# Altium footprint library Connector_Samtec_HLE_SMD.PcbLib: 290 footprints (part 13 of 24) (continued)
## Samtec_HLE-134-02-xxx-DV-A_2x34_P2.54mm_Horizontal [mm] (continued)
F.CrtYd:
  lines w0.05: -43.68,-4.17 -43.68,4.17 43.68,4.17 43.68,-4.17 -43.68,-4.17
F.Fab:
  lines w0.1: -42.41,2.54 -41.91,1.833 -41.41,2.54 ; -43.18,-2.54 -43.18,2.54 43.18,2.54 43.18,-2.54 -43.18,-2.54
  text "'.Designator'" at -4.047,-2.68 h1

## Samtec_HLE-134-02-xxx-DV-BE-A_2x34_P2.54mm_Horizontal [mm]
pads (138):
  rect 1.27x1.68 smd: 1(-41.91,2.72) 2(-41.91,-2.72) 3(-39.37,2.72) 4(-39.37,-2.72) 5(-36.83,2.72) 6(-36.83,-2.72) 7(-34.29,2.72) 8(-34.29,-2.72) 9(-31.75,2.72) 10(-31.75,-2.72) 11(-29.21,2.72) 12(-29.21,-2.72) 13(-26.67,2.72) 14(-26.67,-2.72) 15(-24.13,2.72) 16(-24.13,-2.72) 17(-21.59,2.72) 18(-21.59,-2.72) 19(-19.05,2.72) 20(-19.05,-2.72) 21(-16.51,2.72) 22(-16.51,-2.72) 23(-13.97,2.72) 24(-13.97,-2.72) 25(-11.43,2.72) 26(-11.43,-2.72) 27(-8.89,2.72) 28(-8.89,-2.72) 29(-6.35,2.72) 30(-6.35,-2.72) 31(-3.81,2.72) 32(-3.81,-2.72) 33(-1.27,2.72) 34(-1.27,-2.72) 35(1.27,2.72) 36(1.27,-2.72) 37(3.81,2.72) 38(3.81,-2.72) 39(6.35,2.72) 40(6.35,-2.72) 41(8.89,2.72) 42(8.89,-2.72) 43(11.43,2.72) 44(11.43,-2.72) 45(13.97,2.72) 46(13.97,-2.72) 47(16.51,2.72) 48(16.51,-2.72) 49(19.05,2.72) 50(19.05,-2.72) 51(21.59,2.72) 52(21.59,-2.72) 53(24.13,2.72) 54(24.13,-2.72) 55(26.67,2.72) 56(26.67,-2.72) 57(29.21,2.72) 58(29.21,-2.72) 59(31.75,2.72) 60(31.75,-2.72) 61(34.29,2.72) 62(34.29,-2.72) 63(36.83,2.72) 64(36.83,-2.72) 65(39.37,2.72) 66(39.37,-2.72) 67(41.91,2.72) 68(41.91,-2.72)
  round 0.97 hole 0.97: Un1(-11.43,1.27) Un2(11.43,1.27) Un3(-26.67,-1.27) Un4(-13.97,1.27) Un5(-3.81,1.27) Un6(-31.75,-1.27) Un7(21.59,-1.27) Un8(29.21,1.27) Un9(19.05,1.27) Un10(-39.37,-1.27) Un11(-36.83,1.27) Un12(6.35,1.27) Un13(31.75,1.27) Un14(39.37,1.27) Un15(3.81,1.27) Un16(-34.29,-1.27) Un17(-19.05,-1.27) Un18(-11.43,-1.27) Un19(-6.35,1.27) Un20(36.83,-1.27) Un21(24.13,1.27) Un22(36.83,1.27) Un23(-3.81,-1.27) Un24(39.37,-1.27) Un26(41.91,1.27) Un27(-6.35,-1.27) Un28(-16.51,1.27) Un29(-8.89,-1.27) Un30(13.97,1.27) Un31(34.29,1.27) Un32(16.51,-1.27) Un33(26.67,1.27) Un34(1.27,1.27) Un35(34.29,-1.27) Un36(24.13,-1.27) Un37(-26.67,1.27) Un38(-41.91,1.27) Un39(-1.27,1.27) Un40(-39.37,1.27) Un41(11.43,-1.27) Un43(-29.21,1.27) Un44(-21.59,1.27) Un45(31.75,-1.27) Un46(-1.27,-1.27) Un47(-13.97,-1.27) Un48(21.59,1.27) Un49(8.89,1.27) Un50(-24.13,-1.27) Un51(6.35,-1.27) Un52(19.05,-1.27) Un53(29.21,-1.27) Un54(-29.21,-1.27) Un55(8.89,-1.27) Un56(-8.89,1.27) Un57(-34.29,1.27) Un58(-36.83,-1.27) Un59(-24.13,1.27) Un60(-21.59,-1.27) Un61(-31.75,1.27) Un62(41.91,-1.27) Un63(3.81,-1.27) Un64(-16.51,-1.27) Un65(13.97,-1.27) Un66(-41.91,-1.27) Un67(26.67,-1.27) Un68(-19.05,1.27) Un69(16.51,1.27) Un70(1.27,-1.27)
  round 1.78 hole 1.78: Un25(-40.64,0) Un42(40.64,0)
F.SilkS:
  lines w0.12: -42.805,-2.65 -43.29,-2.65 -43.29,2.65 -42.805,2.65 -42.805,3.56 ; -41.015,-2.65 -40.265,-2.65 ; -41.015,2.65 -40.265,2.65 ; -38.475,-2.65 -37.725,-2.65 ; -38.475,2.65 -37.725,2.65 ; -35.935,-2.65 -35.185,-2.65 ; -35.935,2.65 -35.185,2.65 ; -33.395,-2.65 -32.645,-2.65 ; -33.395,2.65 -32.645,2.65 ; -30.855,-2.65 -30.105,-2.65 ; -30.855,2.65 -30.105,2.65 ; -28.315,-2.65 -27.565,-2.65 ; -28.315,2.65 -27.565,2.65 ; -25.775,-2.65 -25.025,-2.65 ; -25.775,2.65 -25.025,2.65 ; -23.235,-2.65 -22.485,-2.65 ; -23.235,2.65 -22.485,2.65 ; -20.695,-2.65 -19.945,-2.65 ; -20.695,2.65 -19.945,2.65 ; -18.155,-2.65 -17.405,-2.65 ; -18.155,2.65 -17.405,2.65 ; -15.615,-2.65 -14.865,-2.65 ; -15.615,2.65 -14.865,2.65 ; -13.075,-2.65 -12.325,-2.65 ; -13.075,2.65 -12.325,2.65 ; -10.535,-2.65 -9.785,-2.65 ; -10.535,2.65 -9.785,2.65 ; -7.995,-2.65 -7.245,-2.65 ; -7.995,2.65 -7.245,2.65 ; -5.455,-2.65 -4.705,-2.65 ; -5.455,2.65 -4.705,2.65 ; -2.915,-2.65 -2.165,-2.65 ; -2.915,2.65 -2.165,2.65 ; -0.375,-2.65 0.375,-2.65 ; -0.375,2.65 0.375,2.65 ; 2.165,-2.65 2.915,-2.65 ; 2.165,2.65 2.915,2.65 ; 4.705,-2.65 5.455,-2.65 ; 4.705,2.65 5.455,2.65 ; 7.245,-2.65 7.995,-2.65 ; 7.245,2.65 7.995,2.65 ; 9.785,-2.65 10.535,-2.65 ; 9.785,2.65 10.535,2.65 ; 12.325,-2.65 13.075,-2.65 ; 12.325,2.65 13.075,2.65 ; 14.865,-2.65 15.615,-2.65 ; 14.865,2.65 15.615,2.65 ; 17.405,-2.65 18.155,-2.65 ; 17.405,2.65 18.155,2.65 ; 19.945,-2.65 20.695,-2.65 ; 19.945,2.65 20.695,2.65 ; 22.485,-2.65 23.235,-2.65 ; 22.485,2.65 23.235,2.65 ; 25.025,-2.65 25.775,-2.65 ; 25.025,2.65 25.775,2.65 ; 27.565,-2.65 28.315,-2.65 ; 27.565,2.65 28.315,2.65 ; 30.105,-2.65 30.855,-2.65 ; 30.105,2.65 30.855,2.65 ; 32.645,-2.65 33.395,-2.65 ; 32.645,2.65 33.395,2.65 ; 35.185,-2.65 35.935,-2.65 ; 35.185,2.65 35.935,2.65 ; 37.725,-2.65 38.475,-2.65 ; 37.725,2.65 38.475,2.65 ; 40.265,-2.65 41.015,-2.65 ; 40.265,2.65 41.015,2.65 ; 42.805,-2.65 43.29,-2.65 43.29,2.65 42.805,2.65
F.CrtYd:
  lines w0.05: -43.68,-4.06 43.68,-4.06 43.68,4.06 -43.68,4.06 -43.68,-4.06
F.Fab:
  lines w0.1: -42.41,2.54 -41.91,1.833 -41.41,2.54 ; -43.18,-2.54 43.18,-2.54 43.18,2.54 -43.18,2.54 -43.18,-2.54
  text "'.Designator'" at -4.047,-2.68 h1

## Samtec_HLE-134-02-xxx-DV-BE-LC_2x34_P2.54mm_Horizontal [mm]
pads (138):
  rect 1.27x1.68 smd: 1(-41.91,2.72) 2(-41.91,-2.72) 3(-39.37,2.72) 4(-39.37,-2.72) 5(-36.83,2.72) 6(-36.83,-2.72) 7(-34.29,2.72) 8(-34.29,-2.72) 9(-31.75,2.72) 10(-31.75,-2.72) 11(-29.21,2.72) 12(-29.21,-2.72) 13(-26.67,2.72) 14(-26.67,-2.72) 15(-24.13,2.72) 16(-24.13,-2.72) 17(-21.59,2.72) 18(-21.59,-2.72) 19(-19.05,2.72) 20(-19.05,-2.72) 21(-16.51,2.72) 22(-16.51,-2.72) 23(-13.97,2.72) 24(-13.97,-2.72) 25(-11.43,2.72) 26(-11.43,-2.72) 27(-8.89,2.72) 28(-8.89,-2.72) 29(-6.35,2.72) 30(-6.35,-2.72) 31(-3.81,2.72) 32(-3.81,-2.72) 33(-1.27,2.72) 34(-1.27,-2.72) 35(1.27,2.72) 36(1.27,-2.72) 37(3.81,2.72) 38(3.81,-2.72) 39(6.35,2.72) 40(6.35,-2.72) 41(8.89,2.72) 42(8.89,-2.72) 43(11.43,2.72) 44(11.43,-2.72) 45(13.97,2.72) 46(13.97,-2.72) 47(16.51,2.72) 48(16.51,-2.72) 49(19.05,2.72) 50(19.05,-2.72) 51(21.59,2.72) 52(21.59,-2.72) 53(24.13,2.72) 54(24.13,-2.72) 55(26.67,2.72) 56(26.67,-2.72) 57(29.21,2.72) 58(29.21,-2.72) 59(31.75,2.72) 60(31.75,-2.72) 61(34.29,2.72) 62(34.29,-2.72) 63(36.83,2.72) 64(36.83,-2.72) 65(39.37,2.72) 66(39.37,-2.72) 67(41.91,2.72) 68(41.91,-2.72)
  round 0.97 hole 0.97: Un1(3.81,1.27) Un2(-29.21,-1.27) Un3(-39.37,-1.27) Un4(11.43,1.27) Un5(41.91,-1.27) Un6(-21.59,-1.27) Un7(-31.75,1.27) Un8(26.67,1.27) Un9(-11.43,-1.27) Un10(31.75,-1.27) Un11(34.29,-1.27) Un12(-36.83,-1.27) Un13(-19.05,-1.27) Un14(36.83,1.27) Un15(-16.51,-1.27) Un16(-13.97,-1.27) Un17(21.59,1.27) Un18(41.91,1.27) Un19(-8.89,1.27) Un20(24.13,1.27) Un22(-6.35,-1.27) Un23(-16.51,1.27) Un24(1.27,1.27) Un25(1.27,-1.27) Un26(-29.21,1.27) Un27(26.67,-1.27) Un28(-3.81,1.27) Un29(6.35,-1.27) Un30(29.21,1.27) Un31(19.05,-1.27) Un32(24.13,-1.27) Un33(-8.89,-1.27) Un34(16.51,-1.27) Un35(13.97,-1.27) Un36(-24.13,-1.27) Un37(-41.91,1.27) Un38(-11.43,1.27) Un39(29.21,-1.27) Un40(-39.37,1.27) Un41(-41.91,-1.27) Un42(-21.59,1.27) Un43(-13.97,1.27) Un44(-3.81,-1.27) Un45(39.37,-1.27) Un46(39.37,1.27) Un47(11.43,-1.27) Un48(-34.29,1.27) Un49(34.29,1.27) Un50(-6.35,1.27) Un51(8.89,1.27) Un52(3.81,-1.27) Un53(-1.27,1.27) Un54(-34.29,-1.27) Un55(-26.67,1.27) Un56(19.05,1.27) Un57(-19.05,1.27) Un58(8.89,-1.27) Un59(-1.27,-1.27) Un61(13.97,1.27) Un62(6.35,1.27) Un63(21.59,-1.27) Un64(-36.83,1.27) Un65(31.75,1.27) Un66(36.83,-1.27) Un67(-24.13,1.27) Un68(-31.75,-1.27) Un69(16.51,1.27) Un70(-26.67,-1.27)
  round 1.19 hole 1.19: Un21(40.64,0) Un60(-40.64,0)
F.SilkS:
  lines w0.12: -42.805,-2.65 -43.29,-2.65 -43.29,2.65 -42.805,2.65 -42.805,3.56 ; -41.015,-2.65 -40.265,-2.65 ; -41.015,2.65 -40.265,2.65 ; -38.475,-2.65 -37.725,-2.65 ; -38.475,2.65 -37.725,2.65 ; -35.935,-2.65 -35.185,-2.65 ; -35.935,2.65 -35.185,2.65 ; -33.395,-2.65 -32.645,-2.65 ; -33.395,2.65 -32.645,2.65 ; -30.855,-2.65 -30.105,-2.65 ; -30.855,2.65 -30.105,2.65 ; -28.315,-2.65 -27.565,-2.65 ; -28.315,2.65 -27.565,2.65 ; -25.775,-2.65 -25.025,-2.65 ; -25.775,2.65 -25.025,2.65 ; -23.235,-2.65 -22.485,-2.65 ; -23.235,2.65 -22.485,2.65 ; -20.695,-2.65 -19.945,-2.65 ; -20.695,2.65 -19.945,2.65 ; -18.155,-2.65 -17.405,-2.65 ; -18.155,2.65 -17.405,2.65 ; -15.615,-2.65 -14.865,-2.65 ; -15.615,2.65 -14.865,2.65 ; -13.075,-2.65 -12.325,-2.65 ; -13.075,2.65 -12.325,2.65 ; -10.535,-2.65 -9.785,-2.65 ; -10.535,2.65 -9.785,2.65 ; -7.995,-2.65 -7.245,-2.65 ; -7.995,2.65 -7.245,2.65 ; -5.455,-2.65 -4.705,-2.65 ; -5.455,2.65 -4.705,2.65 ; -2.915,-2.65 -2.165,-2.65 ; -2.915,2.65 -2.165,2.65 ; -0.375,-2.65 0.375,-2.65 ; -0.375,2.65 0.375,2.65 ; 2.165,-2.65 2.915,-2.65 ; 2.165,2.65 2.915,2.65 ; 4.705,-2.65 5.455,-2.65 ; 4.705,2.65 5.455,2.65 ; 7.245,-2.65 7.995,-2.65 ; 7.245,2.65 7.995,2.65 ; 9.785,-2.65 10.535,-2.65 ; 9.785,2.65 10.535,2.65 ; 12.325,-2.65 13.075,-2.65 ; 12.325,2.65 13.075,2.65 ; 14.865,-2.65 15.615,-2.65 ; 14.865,2.65 15.615,2.65 ; 17.405,-2.65 18.155,-2.65 ; 17.405,2.65 18.155,2.65 ; 19.945,-2.65 20.695,-2.65 ; 19.945,2.65 20.695,2.65 ; 22.485,-2.65 23.235,-2.65 ; 22.485,2.65 23.235,2.65 ; 25.025,-2.65 25.775,-2.65 ; 25.025,2.65 25.775,2.65 ; 27.565,-2.65 28.315,-2.65 ; 27.565,2.65 28.315,2.65 ; 30.105,-2.65 30.855,-2.65 ; 30.105,2.65 30.855,2.65 ; 32.645,-2.65 33.395,-2.65 ; 32.645,2.65 33.395,2.65 ; 35.185,-2.65 35.935,-2.65 ; 35.185,2.65 35.935,2.65 ; 37.725,-2.65 38.475,-2.65 ; 37.725,2.65 38.475,2.65 ; 40.265,-2.65 41.015,-2.65 ; 40.265,2.65 41.015,2.65 ; 42.805,-2.65 43.29,-2.65 43.29,2.65 42.805,2.65
F.CrtYd:
  lines w0.05: -43.68,-4.06 43.68,-4.06 43.68,4.06 -43.68,4.06 -43.68,-4.06
F.Fab:
  lines w0.1: -42.41,2.54 -41.91,1.833 -41.41,2.54 ; -43.18,-2.54 43.18,-2.54 43.18,2.54 -43.18,2.54 -43.18,-2.54
  text "'.Designator'" at -4.047,-2.68 h1

## Samtec_HLE-134-02-xxx-DV-BE_2x34_P2.54mm_Horizontal [mm]
pads (136):
  rect 1.27x1.68 smd: 1(-41.91,2.72) 2(-41.91,-2.72) 3(-39.37,2.72) 4(-39.37,-2.72) 5(-36.83,2.72) 6(-36.83,-2.72) 7(-34.29,2.72) 8(-34.29,-2.72) 9(-31.75,2.72) 10(-31.75,-2.72) 11(-29.21,2.72) 12(-29.21,-2.72) 13(-26.67,2.72) 14(-26.67,-2.72) 15(-24.13,2.72) 16(-24.13,-2.72) 17(-21.59,2.72) 18(-21.59,-2.72) 19(-19.05,2.72) 20(-19.05,-2.72) 21(-16.51,2.72) 22(-16.51,-2.72) 23(-13.97,2.72) 24(-13.97,-2.72) 25(-11.43,2.72) 26(-11.43,-2.72) 27(-8.89,2.72) 28(-8.89,-2.72) 29(-6.35,2.72) 30(-6.35,-2.72) 31(-3.81,2.72) 32(-3.81,-2.72) 33(-1.27,2.72) 34(-1.27,-2.72) 35(1.27,2.72) 36(1.27,-2.72) 37(3.81,2.72) 38(3.81,-2.72) 39(6.35,2.72) 40(6.35,-2.72) 41(8.89,2.72) 42(8.89,-2.72) 43(11.43,2.72) 44(11.43,-2.72) 45(13.97,2.72) 46(13.97,-2.72) 47(16.51,2.72) 48(16.51,-2.72) 49(19.05,2.72) 50(19.05,-2.72) 51(21.59,2.72) 52(21.59,-2.72) 53(24.13,2.72) 54(24.13,-2.72) 55(26.67,2.72) 56(26.67,-2.72) 57(29.21,2.72) 58(29.21,-2.72) 59(31.75,2.72) 60(31.75,-2.72) 61(34.29,2.72) 62(34.29,-2.72) 63(36.83,2.72) 64(36.83,-2.72) 65(39.37,2.72) 66(39.37,-2.72) 67(41.91,2.72) 68(41.91,-2.72)
  round 0.97 hole 0.97: Un1(6.35,-1.27) Un2(-8.89,-1.27) Un3(-21.59,1.27) Un4(21.59,-1.27) Un5(-3.81,1.27) Un6(21.59,1.27) Un7(1.27,1.27) Un8(-13.97,1.27) Un9(29.21,-1.27) Un10(-34.29,1.27) Un11(8.89,1.27) Un12(-36.83,1.27) Un13(6.35,1.27) Un14(-36.83,-1.27) Un15(-29.21,-1.27) Un16(11.43,-1.27) Un17(26.67,-1.27) Un18(-6.35,1.27) Un19(34.29,1.27) Un20(-11.43,-1.27) Un21(8.89,-1.27) Un22(13.97,-1.27) Un23(34.29,-1.27) Un24(26.67,1.27) Un25(-39.37,-1.27) Un26(-19.05,1.27) Un27(16.51,1.27) Un28(16.51,-1.27) Un29(-11.43,1.27) Un30(-19.05,-1.27) Un31(-39.37,1.27) Un32(36.83,-1.27) Un33(19.05,-1.27) Un34(-26.67,1.27) Un35(11.43,1.27) Un36(13.97,1.27) Un37(-3.81,-1.27) Un38(-29.21,1.27) Un39(1.27,-1.27) Un40(31.75,-1.27) Un41(31.75,1.27) Un42(3.81,1.27) Un43(-24.13,-1.27) Un44(-34.29,-1.27) Un45(-31.75,1.27) Un46(36.83,1.27) Un47(39.37,1.27) Un48(-31.75,-1.27) Un49(-16.51,-1.27) Un50(3.81,-1.27) Un51(-1.27,1.27) Un52(29.21,1.27) Un53(-41.91,-1.27) Un54(-16.51,1.27) Un55(-41.91,1.27) Un56(41.91,-1.27) Un57(-24.13,1.27) Un58(-8.89,1.27) Un59(-1.27,-1.27) Un60(39.37,-1.27) Un61(41.91,1.27) Un62(-13.97,-1.27) Un63(-6.35,-1.27) Un64(-26.67,-1.27) Un65(24.13,-1.27) Un66(-21.59,-1.27) Un67(24.13,1.27) Un68(19.05,1.27)
F.SilkS:
  lines w0.12: -42.805,-2.65 -43.29,-2.65 -43.29,2.65 -42.805,2.65 -42.805,3.56 ; -41.015,-2.65 -40.265,-2.65 ; -41.015,2.65 -40.265,2.65 ; -38.475,-2.65 -37.725,-2.65 ; -38.475,2.65 -37.725,2.65 ; -35.935,-2.65 -35.185,-2.65 ; -35.935,2.65 -35.185,2.65 ; -33.395,-2.65 -32.645,-2.65 ; -33.395,2.65 -32.645,2.65 ; -30.855,-2.65 -30.105,-2.65 ; -30.855,2.65 -30.105,2.65 ; -28.315,-2.65 -27.565,-2.65 ; -28.315,2.65 -27.565,2.65 ; -25.775,-2.65 -25.025,-2.65 ; -25.775,2.65 -25.025,2.65 ; -23.235,-2.65 -22.485,-2.65 ; -23.235,2.65 -22.485,2.65 ; -20.695,-2.65 -19.945,-2.65 ; -20.695,2.65 -19.945,2.65 ; -18.155,-2.65 -17.405,-2.65 ; -18.155,2.65 -17.405,2.65 ; -15.615,-2.65 -14.865,-2.65 ; -15.615,2.65 -14.865,2.65 ; -13.075,-2.65 -12.325,-2.65 ; -13.075,2.65 -12.325,2.65 ; -10.535,-2.65 -9.785,-2.65 ; -10.535,2.65 -9.785,2.65 ; -7.995,-2.65 -7.245,-2.65 ; -7.995,2.65 -7.245,2.65 ; -5.455,-2.65 -4.705,-2.65 ; -5.455,2.65 -4.705,2.65 ; -2.915,-2.65 -2.165,-2.65 ; -2.915,2.65 -2.165,2.65 ; -0.375,-2.65 0.375,-2.65 ; -0.375,2.65 0.375,2.65 ; 2.165,-2.65 2.915,-2.65 ; 2.165,2.65 2.915,2.65 ; 4.705,-2.65 5.455,-2.65 ; 4.705,2.65 5.455,2.65 ; 7.245,-2.65 7.995,-2.65 ; 7.245,2.65 7.995,2.65 ; 9.785,-2.65 10.535,-2.65 ; 9.785,2.65 10.535,2.65 ; 12.325,-2.65 13.075,-2.65 ; 12.325,2.65 13.075,2.65 ; 14.865,-2.65 15.615,-2.65 ; 14.865,2.65 15.615,2.65 ; 17.405,-2.65 18.155,-2.65 ; 17.405,2.65 18.155,2.65 ; 19.945,-2.65 20.695,-2.65 ; 19.945,2.65 20.695,2.65 ; 22.485,-2.65 23.235,-2.65 ; 22.485,2.65 23.235,2.65 ; 25.025,-2.65 25.775,-2.65 ; 25.025,2.65 25.775,2.65 ; 27.565,-2.65 28.315,-2.65 ; 27.565,2.65 28.315,2.65 ; 30.105,-2.65 30.855,-2.65 ; 30.105,2.65 30.855,2.65 ; 32.645,-2.65 33.395,-2.65 ; 32.645,2.65 33.395,2.65 ; 35.185,-2.65 35.935,-2.65 ; 35.185,2.65 35.935,2.65 ; 37.725,-2.65 38.475,-2.65 ; 37.725,2.65 38.475,2.65 ; 40.265,-2.65 41.015,-2.65 ; 40.265,2.65 41.015,2.65 ; 42.805,-2.65 43.29,-2.65 43.29,2.65 42.805,2.65
F.CrtYd:
  lines w0.05: -43.68,-4.06 43.68,-4.06 43.68,4.06 -43.68,4.06 -43.68,-4.06
F.Fab:
  lines w0.1: -42.41,2.54 -41.91,1.833 -41.41,2.54 ; -43.18,-2.54 -43.18,2.54 43.18,2.54 43.18,-2.54 -43.18,-2.54
  text "'.Designator'" at -4.047,-2.68 h1

## Samtec_HLE-134-02-xxx-DV-LC_2x34_P2.54mm_Horizontal [mm]
pads (70):
  rect 1.27x2.29 smd: 1(-41.91,2.525) 2(-41.91,-2.525) 3(-39.37,2.525) 4(-39.37,-2.525) 5(-36.83,2.525) 6(-36.83,-2.525) 7(-34.29,2.525) 8(-34.29,-2.525) 9(-31.75,2.525) 10(-31.75,-2.525) 11(-29.21,2.525) 12(-29.21,-2.525) 13(-26.67,2.525) 14(-26.67,-2.525) 15(-24.13,2.525) 16(-24.13,-2.525) 17(-21.59,2.525) 18(-21.59,-2.525) 19(-19.05,2.525) 20(-19.05,-2.525) 21(-16.51,2.525) 22(-16.51,-2.525) 23(-13.97,2.525) 24(-13.97,-2.525) 25(-11.43,2.525) 26(-11.43,-2.525) 27(-8.89,2.525) 28(-8.89,-2.525) 29(-6.35,2.525) 30(-6.35,-2.525) 31(-3.81,2.525) 32(-3.81,-2.525) 33(-1.27,2.525) 34(-1.27,-2.525) 35(1.27,2.525) 36(1.27,-2.525) 37(3.81,2.525) 38(3.81,-2.525) 39(6.35,2.525) 40(6.35,-2.525) 41(8.89,2.525) 42(8.89,-2.525) 43(11.43,2.525) 44(11.43,-2.525) 45(13.97,2.525) 46(13.97,-2.525) 47(16.51,2.525) 48(16.51,-2.525) 49(19.05,2.525) 50(19.05,-2.525) 51(21.59,2.525) 52(21.59,-2.525) 53(24.13,2.525) 54(24.13,-2.525) 55(26.67,2.525) 56(26.67,-2.525) 57(29.21,2.525) 58(29.21,-2.525) 59(31.75,2.525) 60(31.75,-2.525) 61(34.29,2.525) 62(34.29,-2.525) 63(36.83,2.525) 64(36.83,-2.525) 65(39.37,2.525) 66(39.37,-2.525) 67(41.91,2.525) 68(41.91,-2.525)
  round 1.19 hole 1.19: Un1(-40.64,0) Un2(40.64,0)
F.SilkS:
  lines w0.12: -42.805,-2.65 -43.29,-2.65 -43.29,2.65 -42.805,2.65 -42.805,3.67 ; -41.015,-2.65 -40.265,-2.65 ; -41.015,2.65 -40.265,2.65 ; -38.475,-2.65 -37.725,-2.65 ; -38.475,2.65 -37.725,2.65 ; -35.935,-2.65 -35.185,-2.65 ; -35.935,2.65 -35.185,2.65 ; -33.395,-2.65 -32.645,-2.65 ; -33.395,2.65 -32.645,2.65 ; -30.855,-2.65 -30.105,-2.65 ; -30.855,2.65 -30.105,2.65 ; -28.315,-2.65 -27.565,-2.65 ; -28.315,2.65 -27.565,2.65 ; -25.775,-2.65 -25.025,-2.65 ; -25.775,2.65 -25.025,2.65 ; -23.235,-2.65 -22.485,-2.65 ; -23.235,2.65 -22.485,2.65 ; -20.695,-2.65 -19.945,-2.65 ; -20.695,2.65 -19.945,2.65 ; -18.155,-2.65 -17.405,-2.65 ; -18.155,2.65 -17.405,2.65 ; -15.615,-2.65 -14.865,-2.65 ; -15.615,2.65 -14.865,2.65 ; -13.075,-2.65 -12.325,-2.65 ; -13.075,2.65 -12.325,2.65 ; -10.535,-2.65 -9.785,-2.65 ; -10.535,2.65 -9.785,2.65 ; -7.995,-2.65 -7.245,-2.65 ; -7.995,2.65 -7.245,2.65 ; -5.455,-2.65 -4.705,-2.65 ; -5.455,2.65 -4.705,2.65 ; -2.915,-2.65 -2.165,-2.65 ; -2.915,2.65 -2.165,2.65 ; -0.375,-2.65 0.375,-2.65 ; -0.375,2.65 0.375,2.65 ; 2.165,-2.65 2.915,-2.65 ; 2.165,2.65 2.915,2.65 ; 4.705,-2.65 5.455,-2.65 ; 4.705,2.65 5.455,2.65 ; 7.245,-2.65 7.995,-2.65 ; 7.245,2.65 7.995,2.65 ; 9.785,-2.65 10.535,-2.65 ; 9.785,2.65 10.535,2.65 ; 12.325,-2.65 13.075,-2.65 ; 12.325,2.65 13.075,2.65 ; 14.865,-2.65 15.615,-2.65 ; 14.865,2.65 15.615,2.65 ; 17.405,-2.65 18.155,-2.65 ; 17.405,2.65 18.155,2.65 ; 19.945,-2.65 20.695,-2.65 ; 19.945,2.65 20.695,2.65 ; 22.485,-2.65 23.235,-2.65 ; 22.485,2.65 23.235,2.65 ; 25.025,-2.65 25.775,-2.65 ; 25.025,2.65 25.775,2.65 ; 27.565,-2.65 28.315,-2.65 ; 27.565,2.65 28.315,2.65 ; 30.105,-2.65 30.855,-2.65 ; 30.105,2.65 30.855,2.65 ; 32.645,-2.65 33.395,-2.65 ; 32.645,2.65 33.395,2.65 ; 35.185,-2.65 35.935,-2.65 ; 35.185,2.65 35.935,2.65 ; 37.725,-2.65 38.475,-2.65 ; 37.725,2.65 38.475,2.65 ; 40.265,-2.65 41.015,-2.65 ; 40.265,2.65 41.015,2.65 ; 42.805,-2.65 43.29,-2.65 43.29,2.65 42.805,2.65
F.CrtYd:
  lines w0.05: -43.68,-4.17 43.68,-4.17 43.68,4.17 -43.68,4.17 -43.68,-4.17
F.Fab:
  lines w0.1: -42.41,2.54 -41.91,1.833 -41.41,2.54 ; -43.18,-2.54 -43.18,2.54 43.18,2.54 43.18,-2.54 -43.18,-2.54
  text "'.Designator'" at -4.047,-2.68 h1

## Samtec_HLE-134-02-xxx-DV_2x34_P2.54mm_Horizontal [mm]
pads (68):
  rect 1.27x2.29 smd: 1(-41.91,2.525) 2(-41.91,-2.525) 3(-39.37,2.525) 4(-39.37,-2.525) 5(-36.83,2.525) 6(-36.83,-2.525) 7(-34.29,2.525) 8(-34.29,-2.525) 9(-31.75,2.525) 10(-31.75,-2.525) 11(-29.21,2.525) 12(-29.21,-2.525) 13(-26.67,2.525) 14(-26.67,-2.525) 15(-24.13,2.525) 16(-24.13,-2.525) 17(-21.59,2.525) 18(-21.59,-2.525) 19(-19.05,2.525) 20(-19.05,-2.525) 21(-16.51,2.525) 22(-16.51,-2.525) 23(-13.97,2.525) 24(-13.97,-2.525) 25(-11.43,2.525) 26(-11.43,-2.525) 27(-8.89,2.525) 28(-8.89,-2.525) 29(-6.35,2.525) 30(-6.35,-2.525) 31(-3.81,2.525) 32(-3.81,-2.525) 33(-1.27,2.525) 34(-1.27,-2.525) 35(1.27,2.525) 36(1.27,-2.525) 37(3.81,2.525) 38(3.81,-2.525) 39(6.35,2.525) 40(6.35,-2.525) 41(8.89,2.525) 42(8.89,-2.525) 43(11.43,2.525) 44(11.43,-2.525) 45(13.97,2.525) 46(13.97,-2.525) 47(16.51,2.525) 48(16.51,-2.525) 49(19.05,2.525) 50(19.05,-2.525) 51(21.59,2.525) 52(21.59,-2.525) 53(24.13,2.525) 54(24.13,-2.525) 55(26.67,2.525) 56(26.67,-2.525) 57(29.21,2.525) 58(29.21,-2.525) 59(31.75,2.525) 60(31.75,-2.525) 61(34.29,2.525) 62(34.29,-2.525) 63(36.83,2.525) 64(36.83,-2.525) 65(39.37,2.525) 66(39.37,-2.525) 67(41.91,2.525) 68(41.91,-2.525)
F.SilkS:
  lines w0.12: -42.805,-2.65 -43.29,-2.65 -43.29,2.65 -42.805,2.65 -42.805,3.67 ; -41.015,-2.65 -40.265,-2.65 ; -41.015,2.65 -40.265,2.65 ; -38.475,-2.65 -37.725,-2.65 ; -38.475,2.65 -37.725,2.65 ; -35.935,-2.65 -35.185,-2.65 ; -35.935,2.65 -35.185,2.65 ; -33.395,-2.65 -32.645,-2.65 ; -33.395,2.65 -32.645,2.65 ; -30.855,-2.65 -30.105,-2.65 ; -30.855,2.65 -30.105,2.65 ; -28.315,-2.65 -27.565,-2.65 ; -28.315,2.65 -27.565,2.65 ; -25.775,-2.65 -25.025,-2.65 ; -25.775,2.65 -25.025,2.65 ; -23.235,-2.65 -22.485,-2.65 ; -23.235,2.65 -22.485,2.65 ; -20.695,-2.65 -19.945,-2.65 ; -20.695,2.65 -19.945,2.65 ; -18.155,-2.65 -17.405,-2.65 ; -18.155,2.65 -17.405,2.65 ; -15.615,-2.65 -14.865,-2.65 ; -15.615,2.65 -14.865,2.65 ; -13.075,-2.65 -12.325,-2.65 ; -13.075,2.65 -12.325,2.65 ; -10.535,-2.65 -9.785,-2.65 ; -10.535,2.65 -9.785,2.65 ; -7.995,-2.65 -7.245,-2.65 ; -7.995,2.65 -7.245,2.65 ; -5.455,-2.65 -4.705,-2.65 ; -5.455,2.65 -4.705,2.65 ; -2.915,-2.65 -2.165,-2.65 ; -2.915,2.65 -2.165,2.65 ; -0.375,-2.65 0.375,-2.65 ; -0.375,2.65 0.375,2.65 ; 2.165,-2.65 2.915,-2.65 ; 2.165,2.65 2.915,2.65 ; 4.705,-2.65 5.455,-2.65 ; 4.705,2.65 5.455,2.65 ; 7.245,-2.65 7.995,-2.65 ; 7.245,2.65 7.995,2.65 ; 9.785,-2.65 10.535,-2.65 ; 9.785,2.65 10.535,2.65 ; 12.325,-2.65 13.075,-2.65 ; 12.325,2.65 13.075,2.65 ; 14.865,-2.65 15.615,-2.65 ; 14.865,2.65 15.615,2.65 ; 17.405,-2.65 18.155,-2.65 ; 17.405,2.65 18.155,2.65 ; 19.945,-2.65 20.695,-2.65 ; 19.945,2.65 20.695,2.65 ; 22.485,-2.65 23.235,-2.65 ; 22.485,2.65 23.235,2.65 ; 25.025,-2.65 25.775,-2.65 ; 25.025,2.65 25.775,2.65 ; 27.565,-2.65 28.315,-2.65 ; 27.565,2.65 28.315,2.65 ; 30.105,-2.65 30.855,-2.65 ; 30.105,2.65 30.855,2.65 ; 32.645,-2.65 33.395,-2.65 ; 32.645,2.65 33.395,2.65 ; 35.185,-2.65 35.935,-2.65 ; 35.185,2.65 35.935,2.65 ; 37.725,-2.65 38.475,-2.65 ; 37.725,2.65 38.475,2.65 ; 40.265,-2.65 41.015,-2.65 ; 40.265,2.65 41.015,2.65 ; 42.805,-2.65 43.29,-2.65 43.29,2.65 42.805,2.65
F.CrtYd:
  lines w0.05: -43.68,-4.17 -43.68,4.17 43.68,4.17 43.68,-4.17 -43.68,-4.17
F.Fab:
  lines w0.1: -42.41,2.54 -41.91,1.833 -41.41,2.54 ; -43.18,-2.54 -43.18,2.54 43.18,2.54 43.18,-2.54 -43.18,-2.54
  text "'.Designator'" at -4.047,-2.68 h1

## Samtec_HLE-135-02-xxx-DV-A_2x35_P2.54mm_Horizontal [mm]
pads (72):
  rect 1.27x2.29 smd: 1(-43.18,2.525) 2(-43.18,-2.525) 3(-40.64,2.525) 4(-40.64,-2.525) 5(-38.1,2.525) 6(-38.1,-2.525) 7(-35.56,2.525) 8(-35.56,-2.525) 9(-33.02,2.525) 10(-33.02,-2.525) 11(-30.48,2.525) 12(-30.48,-2.525) 13(-27.94,2.525) 14(-27.94,-2.525) 15(-25.4,2.525) 16(-25.4,-2.525) 17(-22.86,2.525) 18(-22.86,-2.525) 19(-20.32,2.525) 20(-20.32,-2.525) 21(-17.78,2.525) 22(-17.78,-2.525) 23(-15.24,2.525) 24(-15.24,-2.525) 25(-12.7,2.525) 26(-12.7,-2.525) 27(-10.16,2.525) 28(-10.16,-2.525) 29(-7.62,2.525) 30(-7.62,-2.525) 31(-5.08,2.525) 32(-5.08,-2.525) 33(-2.54,2.525) 34(-2.54,-2.525) 35(0,2.525) 36(0,-2.525) 37(2.54,2.525) 38(2.54,-2.525) 39(5.08,2.525) 40(5.08,-2.525) 41(7.62,2.525) 42(7.62,-2.525) 43(10.16,2.525) 44(10.16,-2.525) 45(12.7,2.525) 46(12.7,-2.525) 47(15.24,2.525) 48(15.24,-2.525) 49(17.78,2.525) 50(17.78,-2.525) 51(20.32,2.525) 52(20.32,-2.525) 53(22.86,2.525) 54(22.86,-2.525) 55(25.4,2.525) 56(25.4,-2.525) 57(27.94,2.525) 58(27.94,-2.525) 59(30.48,2.525) 60(30.48,-2.525) 61(33.02,2.525) 62(33.02,-2.525) 63(35.56,2.525) 64(35.56,-2.525) 65(38.1,2.525) 66(38.1,-2.525) 67(40.64,2.525) 68(40.64,-2.525) 69(43.18,2.525) 70(43.18,-2.525)
  round 1.78 hole 1.78: Un1(-41.91,0) Un2(41.91,0)
F.SilkS:
  lines w0.12: -44.075,-2.65 -44.56,-2.65 -44.56,2.65 -44.075,2.65 -44.075,3.67 ; -42.285,-2.65 -41.535,-2.65 ; -42.285,2.65 -41.535,2.65 ; -39.745,-2.65 -38.995,-2.65 ; -39.745,2.65 -38.995,2.65 ; -37.205,-2.65 -36.455,-2.65 ; -37.205,2.65 -36.455,2.65 ; -34.665,-2.65 -33.915,-2.65 ; -34.665,2.65 -33.915,2.65 ; -32.125,-2.65 -31.375,-2.65 ; -32.125,2.65 -31.375,2.65 ; -29.585,-2.65 -28.835,-2.65 ; -29.585,2.65 -28.835,2.65 ; -27.045,-2.65 -26.295,-2.65 ; -27.045,2.65 -26.295,2.65 ; -24.505,-2.65 -23.755,-2.65 ; -24.505,2.65 -23.755,2.65 ; -21.965,-2.65 -21.215,-2.65 ; -21.965,2.65 -21.215,2.65 ; -19.425,-2.65 -18.675,-2.65 ; -19.425,2.65 -18.675,2.65 ; -16.885,-2.65 -16.135,-2.65 ; -16.885,2.65 -16.135,2.65 ; -14.345,-2.65 -13.595,-2.65 ; -14.345,2.65 -13.595,2.65 ; -11.805,-2.65 -11.055,-2.65 ; -11.805,2.65 -11.055,2.65 ; -9.265,-2.65 -8.515,-2.65 ; -9.265,2.65 -8.515,2.65 ; -6.725,-2.65 -5.975,-2.65 ; -6.725,2.65 -5.975,2.65 ; -4.185,-2.65 -3.435,-2.65 ; -4.185,2.65 -3.435,2.65 ; -1.645,-2.65 -0.895,-2.65 ; -1.645,2.65 -0.895,2.65 ; 0.895,-2.65 1.645,-2.65 ; 0.895,2.65 1.645,2.65 ; 3.435,-2.65 4.185,-2.65 ; 3.435,2.65 4.185,2.65 ; 5.975,-2.65 6.725,-2.65 ; 5.975,2.65 6.725,2.65 ; 8.515,-2.65 9.265,-2.65 ; 8.515,2.65 9.265,2.65 ; 11.055,-2.65 11.805,-2.65 ; 11.055,2.65 11.805,2.65 ; 13.595,-2.65 14.345,-2.65 ; 13.595,2.65 14.345,2.65 ; 16.135,-2.65 16.885,-2.65 ; 16.135,2.65 16.885,2.65 ; 18.675,-2.65 19.425,-2.65 ; 18.675,2.65 19.425,2.65 ; 21.215,-2.65 21.965,-2.65 ; 21.215,2.65 21.965,2.65 ; 23.755,-2.65 24.505,-2.65 ; 23.755,2.65 24.505,2.65 ; 26.295,-2.65 27.045,-2.65 ; 26.295,2.65 27.045,2.65 ; 28.835,-2.65 29.585,-2.65 ; 28.835,2.65 29.585,2.65 ; 31.375,-2.65 32.125,-2.65 ; 31.375,2.65 32.125,2.65 ; 33.915,-2.65 34.665,-2.65 ; 33.915,2.65 34.665,2.65 ; 36.455,-2.65 37.205,-2.65 ; 36.455,2.65 37.205,2.65 ; 38.995,-2.65 39.745,-2.65 ; 38.995,2.65 39.745,2.65 ; 41.535,-2.65 42.285,-2.65 ; 41.535,2.65 42.285,2.65 ; 44.075,-2.65 44.56,-2.65 44.56,2.65 44.075,2.65
F.CrtYd:
  lines w0.05: -44.95,-4.17 -44.95,4.17 44.95,4.17 44.95,-4.17 -44.95,-4.17
F.Fab:
  lines w0.1: -43.68,2.54 -43.18,1.833 -42.68,2.54 ; -44.45,-2.54 44.45,-2.54 44.45,2.54 -44.45,2.54 -44.45,-2.54
  text "'.Designator'" at -4.047,-2.68 h1